# Altium footprint library PcbLib1.PcbLib: 150 footprints (part 2 of 10)
Each footprint in its own frame and in the unit in brackets; x right, y up, seen from the top. Pads: shape width x height; smd on the part's side, far side on the other; paste and mask are expansions set on the pad; w line width, h text height; cw(c..) or ccw(c..) is an arc to the next point about the centre after c.
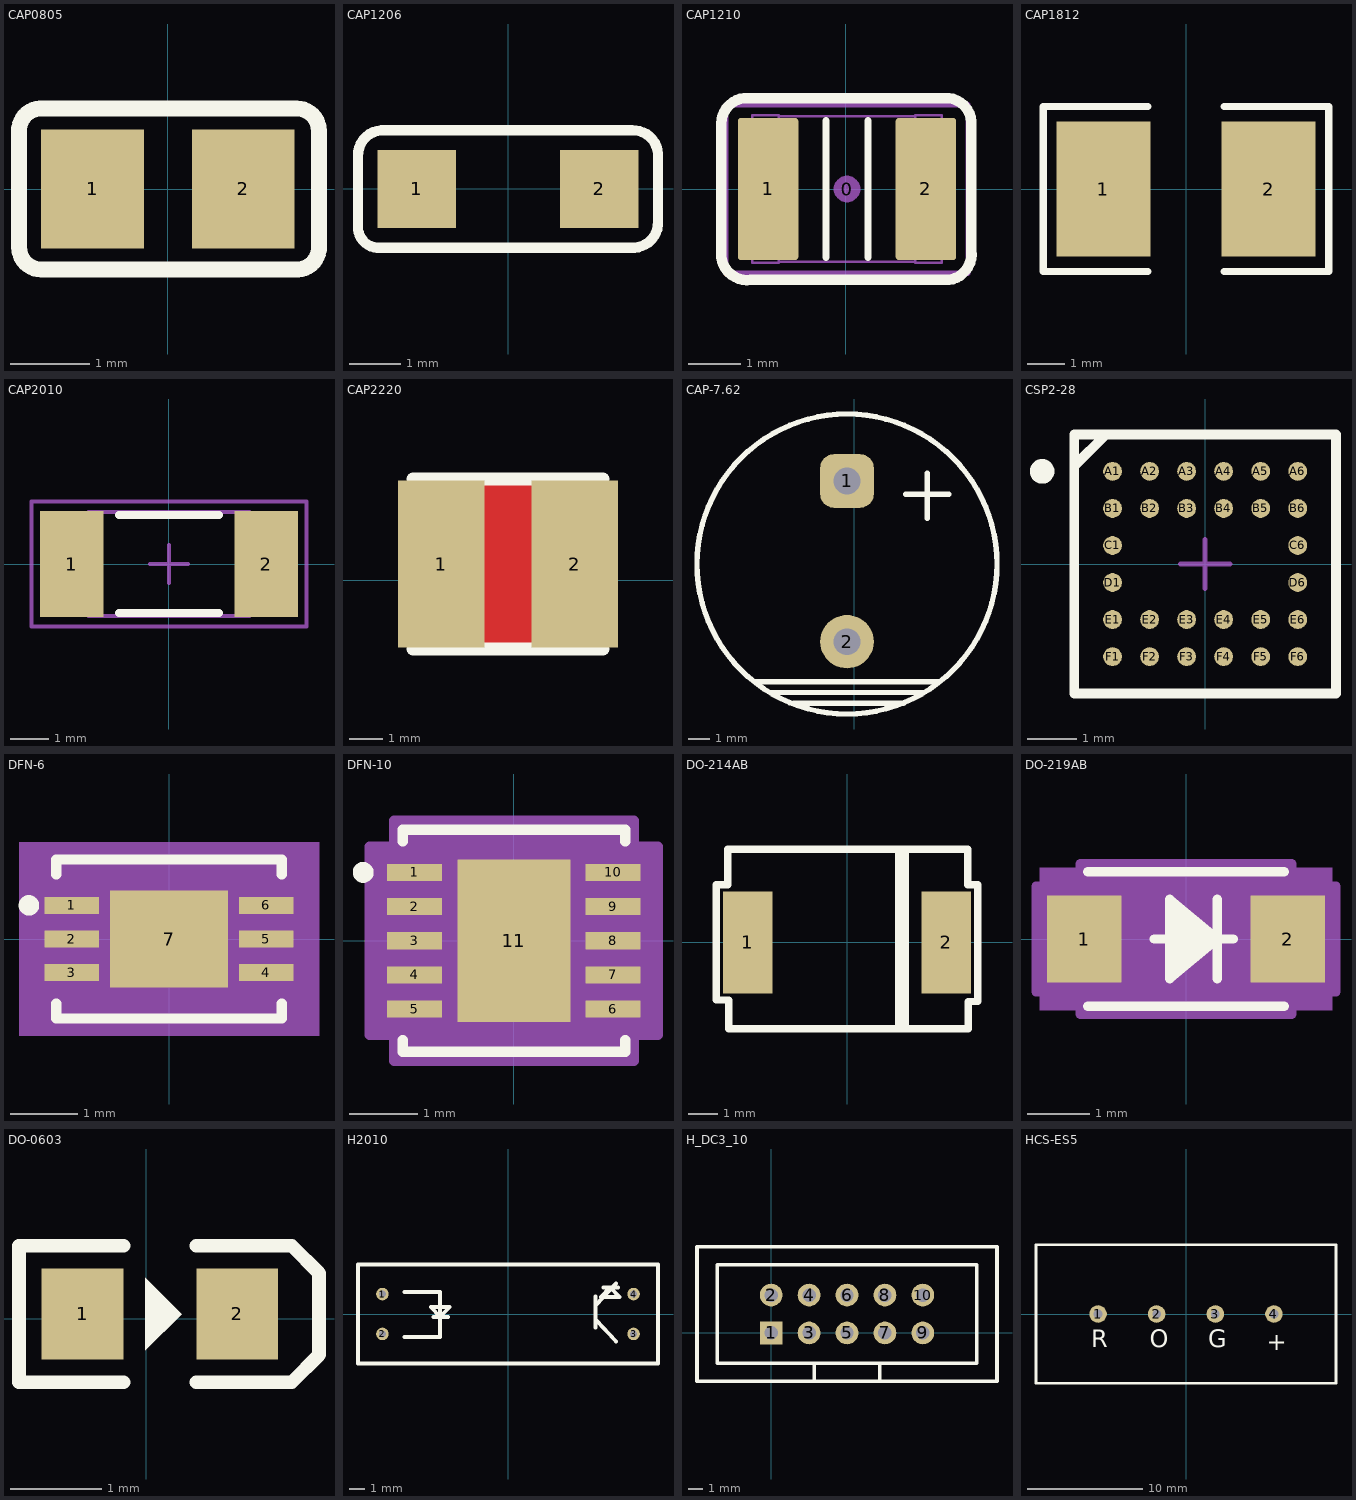
[diagram p1: the footprints below, top view; thin cyan lines are the x and y axes]

## CAP0805 [mm]
pads (2):
  rect 1.3x1.5 smd: 1(-0.95,0) 2(0.95,0)
Top Overlay:
  lines w0.2: -1.88,-0.737 ccw(c-1.6,-0.737) -1.6,-1.016 1.6,-1.016 ccw(c1.626,-0.737) 1.905,-0.762 1.905,0.737 ccw(c1.626,0.737) 1.626,1.016 -1.575,1.016 ccw(c-1.6,0.737) -1.88,0.762 -1.88,-0.737
3D body: height 0.8, standoff 0, extent -1.016,-0.635 1.016,0.635
3D body: height 0.9, standoff 0, extent -1.27,-0.635 -0.889,0.635
3D body: height 0.9, standoff 0, extent 0.889,-0.635 1.27,0.635

## CAP1206 [mil]
pads (2):
  rect 60x60 smd: 1(-70,0) 2(70,0)
Top Overlay:
  lines w7.87: -97,45 ccw(c-96,26) -115,25 -115,-31 ccw(c-99.5,-29.5) -98,-45 -40,-45 40,-45 97,-45 ccw(c96,-26) 115,-25 ; -95,45 -40,45 40,45 95,45 cw(c96,26) 115,27 115,-27
3D body: height 39.37, standoff 0, extent 55,-35 75,35
3D body: height 39.37, standoff 0, extent -75,-35 -55,35
3D body: height 39.37, standoff 0, extent -55,-35 55,35

## CAP1210 [mm]
pads (3):
  round 0.508 on Mech14: 0(0.025,0)
  rrect10% 1.15x2.7 smd: 1(-1.475,0) 2(1.525,0)
Top Overlay:
  lines w0.127: -0.375,-1.3 -0.375,1.3 ; 0.425,-1.3 0.425,1.3
  lines w0.2: 2.388,-1.27 2.388,1.194 ccw(c1.905,1.245) 1.956,1.727 -1.93,1.727 ccw(c-1.867,1.232) -2.362,1.168 -2.362,-1.295 ccw(c-1.867,-1.232) -1.803,-1.727 1.956,-1.727 ccw(c1.892,-1.232) 2.388,-1.168
Mechanical 13:
  lines w0.05: -1.275,-1.38 1.325,-1.38 ; -1.275,1.38 1.325,1.38 ; -1.775,-1.4 -1.275,-1.4 -1.275,1.4 -1.775,1.4 -1.775,-1.4 ; 1.325,-1.4 1.325,1.4 1.825,1.4 1.825,-1.4 1.325,-1.4
Mechanical 14:
  lines w0.1: -2.275,-1.6 -2.275,1.6 2.325,1.6 2.325,-1.6 -2.275,-1.6
3D body "CAP_1210.STEP": height 2.19, standoff -0.01, extent -1.774,-1.4 1.826,1.4

## CAP1812 [mm]
pads (2):
  rect 2.5x3.6 smd: 1(-2.2,0) 2(2.2,0)
Top Overlay:
  lines w0.2: -1.016,-2.2 -3.81,-2.2 -3.81,2.2 -1.016,2.2 ; 1.016,-2.2 3.81,-2.2 3.81,2.2 1.016,2.2
3D body: height 0.9, standoff 0, extent -2.54,0.635 -2.032,1.524
3D body: height 0.9, standoff 0, extent -2.54,-1.524 -2.032,-0.635
3D body: height 0.9, standoff 0, extent 2.159,-1.524 2.667,-0.635
3D body: height 0.9, standoff 0, extent 2.159,0.635 2.667,1.524
3D body: height 1.2, standoff 0, extent -2.286,-1.651 2.286,1.651

## CAP2010 [mm]
pads (2):
  rect 1.65x2.75 smd: 1(-2.525,0) 2(2.525,0)
Top Overlay:
  lines w0.2: -1.3,-1.275 1.3,-1.275 ; -1.3,1.275 1.3,1.275
Mechanical 13:
  lines w0.1: -2.1,-1.35 2.1,-1.35 2.1,1.35 -2.1,1.35 -2.1,-1.35
Mechanical 15:
  lines w0.1: -0.5,0 0.5,0 ; 0,-0.5 0,0.5 ; -3.575,-1.625 3.575,-1.625 3.575,1.625 -3.575,1.625 -3.575,-1.625
3D body: height 0.6, standoff 0, extent -2.1,-1.35 2.1,1.35

## CAP2220 [mm]
pads (2):
  rect 2.601x5 smd: 1(-7.793,0.48) 2(-3.793,0.48)
Top Layer:
  pour cut-out: -6.528,2.87 -6.528,-2.057 -5.055,-2.057 -5.055,2.87
Top Overlay:
  lines w0.381: -8.643,-2.07 -2.943,-2.07 ; -8.643,3.03 -2.943,3.03
Mechanical 15:
  lines w0.003: -5.818,1.006 -5.767,1.057

## CAP-7.62 [mil]
pads (2):
  rrect50% 100x100 hole 50: 1(-14,-1130)
  round 100 hole 50: 2(-14,-1430)
Top Overlay:
  circle w10: c-14,-1285 r280.04
  lines w10: -184,-1505 156,-1505 ; -154,-1525 126,-1525 ; -114,-1545 91,-1545 ; 96,-1155 176,-1155 ; 136,-1200 136,-1115

## CSP2-28 [mm]
pads (28):
  round 0.381 smd mask+0.025: A1(-1.875,1.875) A2(-1.125,1.875) A3(-0.375,1.875) A4(0.375,1.875) A5(1.125,1.875) A6(1.875,1.875) B1(-1.875,1.125) B2(-1.125,1.125) B3(-0.375,1.125) B4(0.375,1.125) B5(1.125,1.125) B6(1.875,1.125) C1(-1.875,0.375) C6(1.875,0.375) D1(-1.875,-0.375) D6(1.875,-0.375) E1(-1.875,-1.125) E2(-1.125,-1.125) E3(-0.375,-1.125) E4(0.375,-1.125) E5(1.125,-1.125) E6(1.875,-1.125) F1(-1.875,-1.875) F2(-1.125,-1.875) F3(-0.375,-1.875) F4(0.375,-1.875) F5(1.125,-1.875) F6(1.875,-1.875)
Top Overlay:
  circle w0.25: c-3.3,1.875 r0.125
  lines w0.2: -2.65,1.983 -2.008,2.625 ; -2.65,-2.625 -2.65,2.625 2.65,2.625 2.65,-2.625 -2.65,-2.625
Mechanical 16:
  lines w0.1: -0.5,0 0.5,0 ; 0,-0.5 0,0.5 ; -2.65,-2.625 -2.65,2.625 2.65,2.625 2.65,-2.625 -2.65,-2.625

## DFN-6 [mm]
pads (7):
  rect 0.808x0.255 smd paste+0 mask+0: 1(-1.445,0.5) 2(-1.445,0) 3(-1.445,-0.5) 4(1.445,-0.5) 5(1.445,0) 6(1.445,0.5)
  rect 1.753x1.448 smd paste+0 mask+0: 7(0,0)
Top Overlay:
  lines w0.152: -2.064,0.426 cw(c-2.083,0.5) -2.046,0.433 ; -1.676,-0.96 -1.676,-1.181 1.676,-1.181 1.676,-0.96 ; -1.676,0.96 -1.676,1.181 1.676,1.181 1.676,0.96
Mechanical 5:
  region: 2.23,-1.435 -2.23,-1.435 -2.23,1.435 2.23,1.435
Mechanical 13:
  lines w0: -0.305,1.054 ccw(c0,1.054) 0.305,1.054
  lines w0.025: -1.549,-1.054 -1.549,1.054 1.549,1.054 1.549,-1.054 -1.549,-1.054
Mechanical 15:
  region: -1.803,-0.881 -2.103,-0.881 -2.103,0.881 -1.803,0.881 -1.803,1.308 1.803,1.308 1.803,0.881 2.103,0.881 2.103,-0.881 1.803,-0.881 1.803,-1.308 -1.803,-1.308
  lines w0.152: -2.103,-0.881 -1.803,-0.881 -1.803,-1.308 1.803,-1.308 1.803,-0.881 2.103,-0.881 2.103,0.881 1.803,0.881 1.803,1.308 -1.803,1.308 -1.803,0.881 -2.103,0.881 -2.103,-0.881
3D body "DFN-6_DCB_LIT.step": height 0.81, standoff 0, extent -1.549,-1.054 1.549,1.054
3D body: height 0.25, standoff 0, extent 0,0 0.254,0.254

## DFN-10 [mm]
pads (11):
  rect 0.805x0.25 smd: 1(-1.452,1) 2(-1.452,0.5) 3(-1.452,0) 4(-1.452,-0.5) 5(-1.452,-1) 6(1.452,-1) 7(1.452,-0.5) 8(1.452,0) 9(1.452,0.5) 10(1.452,1)
  rect 1.65x2.38 smd paste-1.177: 11(0,0)
Top Overlay:
  lines w0.152: -2.188,0.926 cw(c-2.206,1) -2.169,0.933 ; -1.627,-1.458 -1.627,-1.627 1.627,-1.627 1.627,-1.458 ; -1.627,1.458 -1.627,1.627 1.627,1.627 1.627,1.458
Top Paste:
  region: 0.825,1.19 -0.825,1.19 -0.825,-1.19 0.825,-1.19
Mechanical 13:
  circle w0.152: c-1.05,1 r0.076
  lines w0: -0.305,1.5 ccw(c0,1.5) 0.305,1.5
  lines w0.025: -1.5,-1.5 1.5,-1.5 1.5,1.5 -1.5,1.5 -1.5,-1.5
Mechanical 15:
  region: -1.754,-1.379 -2.109,-1.379 -2.109,1.379 -1.754,1.379 -1.754,1.754 1.754,1.754 1.754,1.379 2.109,1.379 2.109,-1.379 1.754,-1.379 1.754,-1.754 -1.754,-1.754
  lines w0.152: -2.109,-1.379 -2.109,1.379 -1.754,1.379 -1.754,1.754 1.754,1.754 1.754,1.379 2.109,1.379 2.109,-1.379 1.754,-1.379 1.754,-1.754 -1.754,-1.754 -1.754,-1.379 -2.109,-1.379
3D body: height 0.25, standoff 0, extent 0,0 0.254,0.254
3D body "User Library-DFN10-1.STEP": height 0.78, standoff -0.02, extent -1.51,-1.501 1.51,1.499

## DO-214AB [mm]
pads (2):
  rect 1.7x3.5 smd: 1(-3.4,0) 2(3.4,0)
Top Overlay:
  lines w0.254: 1.499,-2.972 2.007,-2.972 2.007,3.2 1.778,3.2 1.778,-2.972 1.93,-2.972 1.702,-2.972 ; -4.496,-1.981 -4.064,-1.981 -4.064,-2.032 -4.064,-2.972 4.166,-2.972 4.166,-2.032 4.496,-2.032 4.496,1.981 4.14,1.981 4.14,3.2 -4.089,3.2 -4.089,1.981 -4.496,1.981 -4.496,-1.981
3D body "User Library-DO-214AB SMC.STEP": height 2.27, standoff -0.03, extent -3.949,-2.848 4.001,3.052

## DO-219AB [mm]
pads (2):
  rect 1.2x1.4 smd paste+0 mask+0: 1(-1.637,0) 2(1.637,0)
Top Overlay:
  lines w0.152: -1.575,-1.079 1.575,-1.079 ; -1.575,1.079 1.575,1.079 ; -0.511,0 0.759,0 ; -0.257,-0.508 0.505,0 ; -0.257,-0.381 0.505,0 ; -0.257,-0.254 0.505,0 ; -0.257,-0.127 0.505,0 ; -0.257,0.127 0.505,0 ; -0.257,0.254 0.505,0 ; -0.257,0.381 0.505,0 ; -0.257,0.508 0.505,0 ; 0.505,-0.635 0.505,0.635 ; 0.505,0 -0.257,0.635 -0.257,-0.635 0.505,0
Mechanical 5:
  region: 2.346,-1.143 -2.346,-1.143 -2.346,1.143 2.346,1.143
Mechanical 13:
  lines w0.025: -1.448,-0.476 -0.972,-0.953 ; -1.448,0.476 -0.972,0.953 ; -0.511,0 0.759,0 ; -0.257,-0.508 0.505,0 ; -0.257,-0.381 0.505,0 ; -0.257,-0.254 0.505,0 ; -0.257,-0.127 0.505,0 ; -0.257,0.127 0.505,0 ; -0.257,0.254 0.505,0 ; -0.257,0.381 0.505,0 ; -0.257,0.508 0.505,0 ; 0.505,-0.635 0.505,0.635 ; 0.505,0 -0.257,0.635 -0.257,-0.635 0.505,0 ; -1.956,-0.597 -1.448,-0.597 -1.448,0.597 -1.956,0.597 -1.956,-0.597 ; -1.448,-0.953 -1.448,0.953 1.448,0.953 1.448,-0.953 -1.448,-0.953 ; 1.448,-0.597 1.956,-0.597 1.956,0.597 1.448,0.597 1.448,-0.597
Mechanical 15:
  region: -1.702,-0.851 -2.41,-0.851 -2.41,0.851 -1.702,0.851 -1.702,1.206 1.702,1.206 1.702,0.851 2.41,0.851 2.41,-0.851 1.702,-0.851 1.702,-1.206 -1.702,-1.206
  lines w0.152: -2.41,-0.851 -1.702,-0.851 -1.702,-1.206 1.702,-1.206 1.702,-0.851 2.41,-0.851 2.41,0.851 1.702,0.851 1.702,1.206 -1.702,1.206 -1.702,0.851 -2.41,0.851 -2.41,-0.851
3D body: height 0.25, standoff 0, extent 0,0 0.254,0.254
3D body "DO-219AB-L.step": height 0.82, standoff 0, extent -1.956,-0.952 1.956,0.952

## DO-0603 [mm]
pads (2):
  rect 0.9x1 smd: 1(-0.698,0.051) 2(1.002,0.051)
Top Overlay:
  region: 0.392,0.051 -0.008,-0.349 -0.008,0.051 -0.008,0.451
  lines w0.15: -1.398,0.781 -1.398,-0.699 -0.248,-0.699 ; -1.398,0.801 -0.248,0.801 ; 0.552,-0.699 1.602,-0.699 1.902,-0.399 1.902,-0.299 1.902,0.401 1.902,0.501 1.602,0.801 0.552,0.801
3D body "SD0603.step": height 0.81, standoff 0, extent -0.699,-0.447 1.003,0.549

## H2010 [mm]
pads (4):
  round 0.8 hole 0.45: 1(-8,1.27) 2(-8,-1.27) 3(8,-1.27) 4(8,1.27)
Top Overlay:
  lines w0.254: -6.604,-1.473 -4.318,-1.473 -4.318,1.397 -6.604,1.397 ; -4.75,-0.178 -3.81,-0.178 ; 5.563,-0.864 5.563,1.118 ; 5.588,-0.381 6.888,-1.738 ; 5.588,0.574 6.888,1.93 ; 6.071,1.702 7.01,1.702 ; -9.55,-3.15 -9.55,3.15 9.55,3.15 9.55,-3.15 -9.55,-3.15 ; -4.902,0.432 -4.318,-0.178 -3.734,0.432 -4.902,0.432 ; 5.918,1.092 7.087,1.092 6.502,1.702 5.918,1.092

## H_DC3_10 [mil]
height 68.11
pads (10):
  rect 60x60 hole 35.43: 1(0,0)
  round 60 hole 35.43: 2(0,100) 3(100,0) 4(100,100) 5(200,0) 6(200,100) 7(300,0) 8(300,100) 9(400,0) 10(400,100)
Top Overlay:
  lines w10: 113.39,-127.17 113.39,-79.92 ; 286.61,-127.17 286.61,-79.92 ; -195.76,-127.17 595.76,-127.17 595.76,227.16 -195.76,227.17 -195.76,-127.17 ; -142.52,-79.92 542.52,-79.92 542.52,179.92 -142.52,179.92 -142.52,-79.92
3D body "IDC10.step": height 366.02, standoff -122.17, extent -200.21,-122.21 599,226.21

## HCS-ES5 [mil]
pads (4):
  round 60 hole 30: 1(-300,0) 2(-100,0) 3(100,0) 4(300,0)
Top Overlay:
  lines w10: -511.81,-236.22 -511.81,236.22 511.81,236.22 511.81,-236.22 -511.81,-236.22
  text "O" at -124,-114 h60
  text "G" at 76,-114 h60
  text "R" at -324,-114 h60
  text "+" at 276,-124 h60